# Altium schematic symbol library LATTICEPLDS_Library.SchLib: 291 symbols (part 6 of 32)
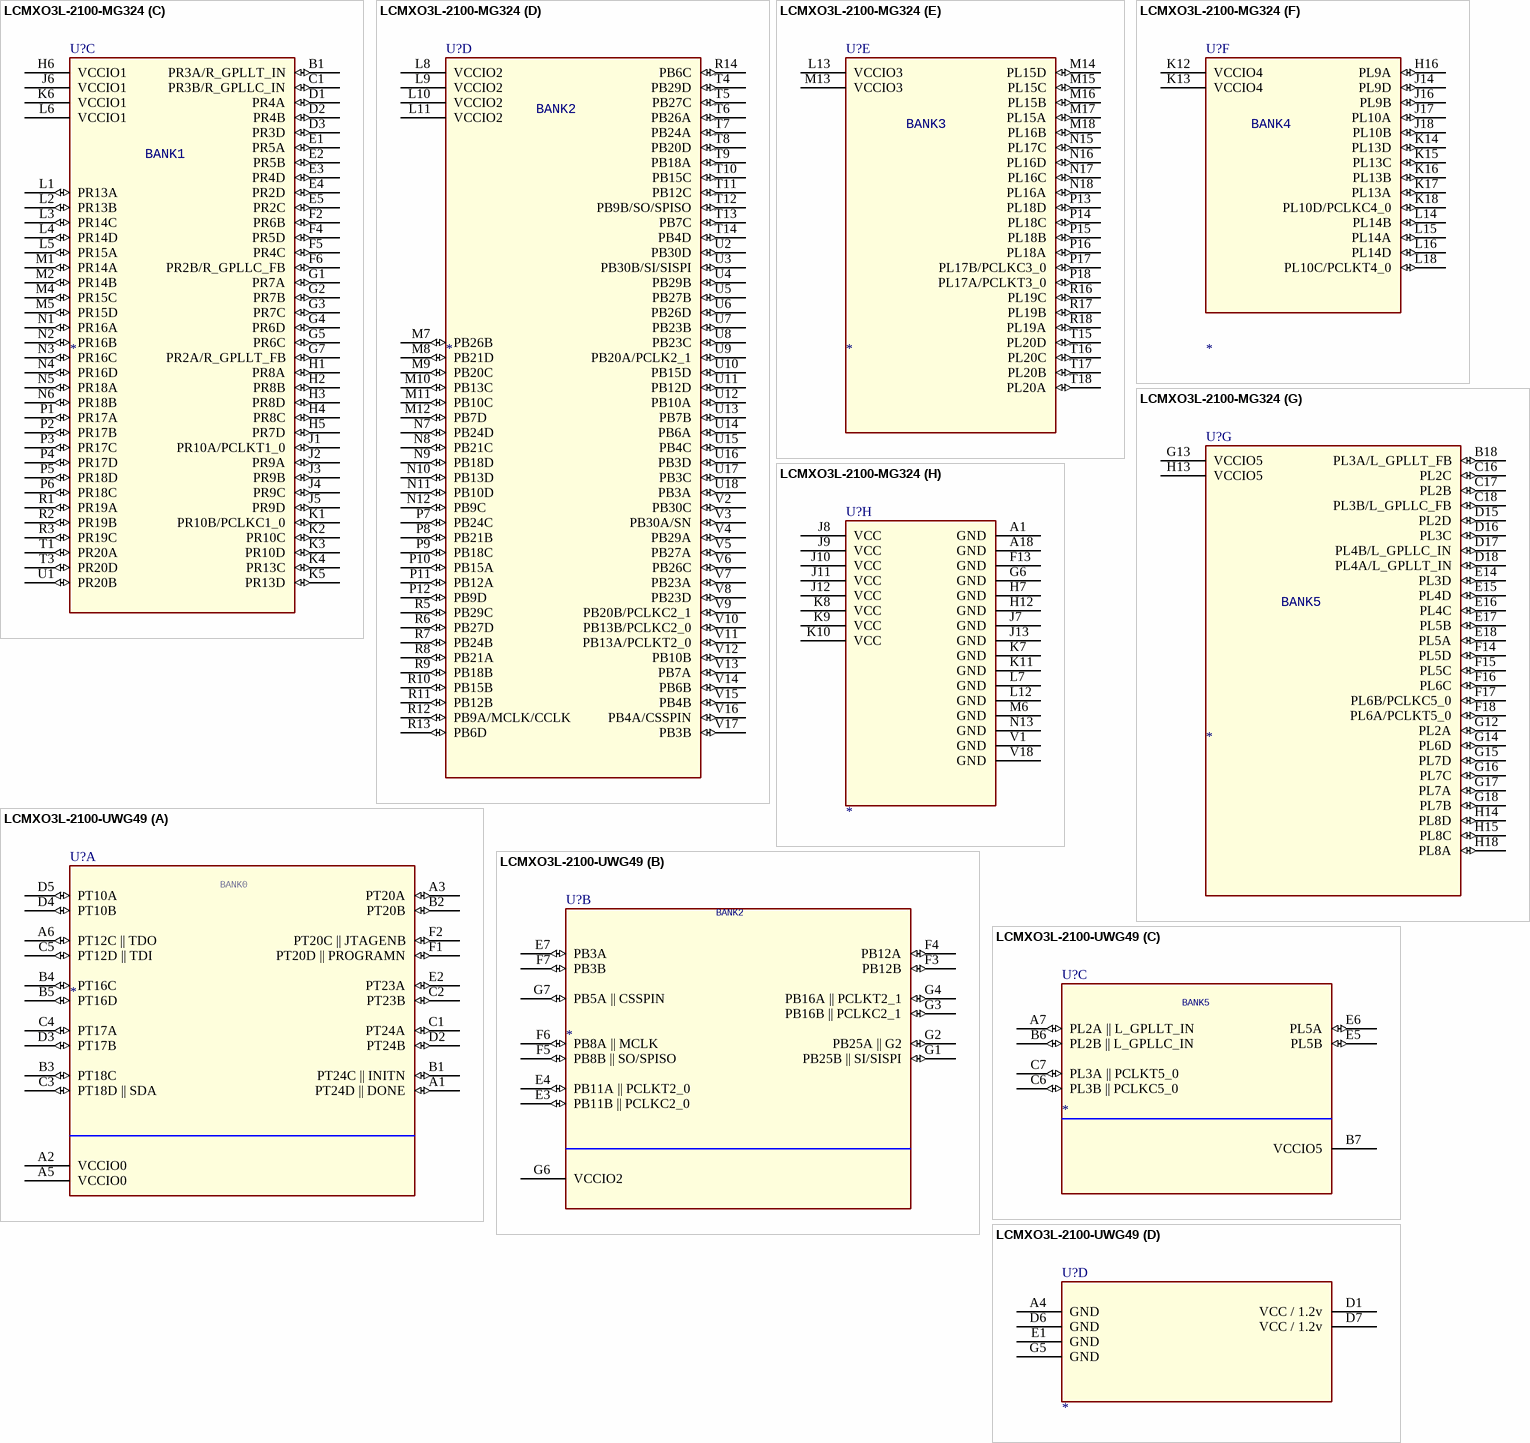
[diagram p308: symbols LCMXO3L-2100-MG324 to LCMXO3L-2100-UWG49]

## LCMXO3L-2100-MG324
designator U?
SWAP_INFO: (S1+S2+S3+S4+S5+S6+S7+S8); SPLIT_INST: TRUE
part A pins: A2 PT28B (io), A3 PT27A (io), A4 PT26A (io), A5 PT25A (io), A6 PT24C (io), A7 PT23A (io), A8 PT21A (io), A9 PT20D/SDA/PCLKC0_0 (io), A10 PT18A/PCLKTO_1 (io), A11 PT14A (io), A12 PT13A (io), A13 PT12D (io), A14 PT12A (io), A15 PT11A (io), A16 PT10A (io), A17 PT9A (io), B2 PT28A (io), B3 PT27B (io), B4 PT26B (io), B5 PT25B (io), B6 PT24D (io), B7 PT23B (io), B8 PT21B (io), B9 PT20C/SCL/PCLKT0_0 (io), B10 PT18B/PCLKC0_1 (io), B11 PT14B (io), B12 PT13B (io), B13 PT12C (io), B14 PT12B (io), B15 PT11B (io), B16 PT10B (io), B17 PT9B (io)
part B pins: C2 NC (io), C3 PT28C/INITN (io), C4 PT27C (io), C5 PT26C (io), C6 PT25D (io), C7 PT24B (io), C8 PT21C (io), C9 PT19C (io), C10 PT19B (io), C11 PT14C (io), C12 PT13C/TDO (io), C13 NC (io), C14 PT11C (io), C15 PT9C (io), D4 PT28D/DONE (io), D5 PT27D (io), D6 PT25C (io), D7 PT24A (io), D8 PT22D (io), D9 PT19D (io), D10 PT19A (io), D11 PT14D (io), D12 PT13D/TDI (io), D13 PT11D (io), D14 PT9D (io), E6 PT26D (io), E7 PT23D/PROGRAMN (io), E8 PT22C (io), E9 PT20A (io), E10 PT18D (io), E11 PT15D/TMS (io), E12 NC (io), E13 PT10C (io), F1 NC (io), F3 NC (io), F7 PT23C/JTAGENB (io), F8 PT22B (io), F9 PT20B (io), F10 PT18C (io), F11 PT15C/TCK (io), F12 PT10D (io), G8 PT22A (io), G9 PT21D (io), G10 PT15B (io), G11 PT15A (io), H8 VCCIO0 (power), H9 VCCIO0 (power), H10 VCCIO0 (power), H11 VCCIO0 (power), H17 NC (io), J15 NC (io), L17 NC (io), M3 NC (io), N14 NC (io), R4 NC (io), R15 NC (io), T2 NC (io)
part C pins: B1 PR3A/R_GPLLT_IN (io), C1 PR3B/R_GPLLC_IN (io), D1 PR4A (io), D2 PR4B (io), D3 PR3D (io), E1 PR5A (io), E2 PR5B (io), E3 PR4D (io), E4 PR2D (io), E5 PR2C (io), F2 PR6B (io), F4 PR5D (io), F5 PR4C (io), F6 PR2B/R_GPLLC_FB (io), G1 PR7A (io), G2 PR7B (io), G3 PR7C (io), G4 PR6D (io), G5 PR6C (io), G7 PR2A/R_GPLLT_FB (io), H1 PR8A (io), H2 PR8B (io), H3 PR8D (io), H4 PR8C (io), H5 PR7D (io), H6 VCCIO1 (power), J1 PR10A/PCLKT1_0 (io), J2 PR9A (io), J3 PR9B (io), J4 PR9C (io), J5 PR9D (io), J6 VCCIO1 (power), K1 PR10B/PCLKC1_0 (io), K2 PR10C (io), K3 PR10D (io), K4 PR13C (io), K5 PR13D (io), K6 VCCIO1 (power), L1 PR13A (io), L2 PR13B (io), L3 PR14C (io), L4 PR14D (io), L5 PR15A (io), L6 VCCIO1 (power), M1 PR14A (io), M2 PR14B (io), M4 PR15C (io), M5 PR15D (io), N1 PR16A (io), N2 PR16B (io), N3 PR16C (io), N4 PR16D (io), N5 PR18A (io), N6 PR18B (io), P1 PR17A (io), P2 PR17B (io), P3 PR17C (io), P4 PR17D (io), P5 PR18D (io), P6 PR18C (io), R1 PR19A (io), R2 PR19B (io), R3 PR19C (io), T1 PR20A (io), T3 PR20D (io), U1 PR20B (io)
part D pins: L8 VCCIO2 (power), L9 VCCIO2 (power), L10 VCCIO2 (power), L11 VCCIO2 (power), M7 PB26B (io), M8 PB21D (io), M9 PB20C (io), M10 PB13C (io), M11 PB10C (io), M12 PB7D (io), N7 PB24D (io), N8 PB21C (io), N9 PB18D (io), N10 PB13D (io), N11 PB10D (io), N12 PB9C (io), P7 PB24C (io), P8 PB21B (io), P9 PB18C (io), P10 PB15A (io), P11 PB12A (io), P12 PB9D (io), R5 PB29C (io), R6 PB27D (io), R7 PB24B (io), R8 PB21A (io), R9 PB18B (io), R10 PB15B (io), R11 PB12B (io), R12 PB9A/MCLK/CCLK (io), R13 PB6D (io), R14 PB6C (io), T4 PB29D (io), T5 PB27C (io), T6 PB26A (io), T7 PB24A (io), T8 PB20D (io), T9 PB18A (io), T10 PB15C (io), T11 PB12C (io), T12 PB9B/SO/SPISO (io), T13 PB7C (io), T14 PB4D (io), U2 PB30D (io), U3 PB30B/SI/SISPI (io), U4 PB29B (io), U5 PB27B (io), U6 PB26D (io), U7 PB23B (io), U8 PB23C (io), U9 PB20A/PCLK2_1 (io), U10 PB15D (io), U11 PB12D (io), U12 PB10A (io), U13 PB7B (io), U14 PB6A (io), U15 PB4C (io), U16 PB3D (io), U17 PB3C (io), U18 PB3A (io), V2 PB30C (io), V3 PB30A/SN (io), V4 PB29A (io), V5 PB27A (io), V6 PB26C (io), V7 PB23A (io), V8 PB23D (io), V9 PB20B/PCLKC2_1 (io), V10 PB13B/PCLKC2_0 (io), V11 PB13A/PCLKT2_0 (io), V12 PB10B (io), V13 PB7A (io), V14 PB6B (io), V15 PB4B (io), V16 PB4A/CSSPIN (io), V17 PB3B (io)
part E pins: L13 VCCIO3 (power), M13 VCCIO3 (power), M14 PL15D (io), M15 PL15C (io), M16 PL15B (io), M17 PL15A (io), M18 PL16B (io), N15 PL17C (io), N16 PL16D (io), N17 PL16C (io), N18 PL16A (io), P13 PL18D (io), P14 PL18C (io), P15 PL18B (io), P16 PL18A (io), P17 PL17B/PCLKC3_0 (io), P18 PL17A/PCLKT3_0 (io), R16 PL19C (io), R17 PL19B (io), R18 PL19A (io), T15 PL20D (io), T16 PL20C (io), T17 PL20B (io), T18 PL20A (io)
part F pins: H16 PL9A (io), J14 PL9D (io), J16 PL9B (io), J17 PL10A (io), J18 PL10B (io), K12 VCCIO4 (power), K13 VCCIO4 (power), K14 PL13D (io), K15 PL13C (io), K16 PL13B (io), K17 PL13A (io), K18 PL10D/PCLKC4_0 (io), L14 PL14B (io), L15 PL14A (io), L16 PL14D (io), L18 PL10C/PCLKT4_0 (io)
part G pins: B18 PL3A/L_GPLLT_FB (io), C16 PL2C (io), C17 PL2B (io), C18 PL3B/L_GPLLC_FB (io), D15 PL2D (io), D16 PL3C (io), D17 PL4B/L_GPLLC_IN (io), D18 PL4A/L_GPLLT_IN (io), E14 PL3D (io), E15 PL4D (io), E16 PL4C (io), E17 PL5B (io), E18 PL5A (io), F14 PL5D (io), F15 PL5C (io), F16 PL6C (io), F17 PL6B/PCLKC5_0 (io), F18 PL6A/PCLKT5_0 (io), G12 PL2A (io), G13 VCCIO5 (power), G14 PL6D (io), G15 PL7D (io), G16 PL7C (io), G17 PL7A (io), G18 PL7B (io), H13 VCCIO5 (power), H14 PL8D (io), H15 PL8C (io), H18 PL8A (io)
part H pins: A1 GND (power), A18 GND (power), F13 GND (power), G6 GND (power), H7 GND (power), H12 GND (power), J7 GND (power), J8 VCC (power), J9 VCC (power), J10 VCC (power), J11 VCC (power), J12 VCC (power), J13 GND (power), K7 GND (power), K8 VCC (power), K9 VCC (power), K10 VCC (power), K11 GND (power), L7 GND (power), L12 GND (power), M6 GND (power), N13 GND (power), V1 GND (power), V18 GND (power)
part A text: BANK0
part B text: BANK0
part C text: BANK1
part D text: BANK2
part E text: BANK3
part F text: BANK4
part G text: BANK5

## LCMXO3L-2100-UWG49
designator U?
SWAP_INFO: (S1+S2+S3+S4); SPLIT_INST: TRUE
part A pins: A1 PT24D || DONE (io), A2 VCCIO0 (power), A3 PT20A (io), A5 VCCIO0 (power), A6 PT12C || TDO (io), B1 PT24C || INITN (io), B2 PT20B (io), B3 PT18C (io), B4 PT16C (io), B5 PT16D (io), C1 PT24A (io), C2 PT23B (io), C3 PT18D || SDA (io), C4 PT17A (io), C5 PT12D || TDI (io), D2 PT24B (io), D3 PT17B (io), D4 PT10B (io), D5 PT10A (io), E2 PT23A (io), F1 PT20D || PROGRAMN (io), F2 PT20C || JTAGENB (io)
part B pins: E3 PB11B || PCLKC2_0 (io), E4 PB11A || PCLKT2_0 (io), E7 PB3A (io), F3 PB12B (io), F4 PB12A (io), F5 PB8B || SO/SPISO (io), F6 PB8A || MCLK (io), F7 PB3B (io), G1 PB25B || SI/SISPI (io), G2 PB25A || G2 (io), G3 PB16B || PCLKC2_1 (io), G4 PB16A || PCLKT2_1 (io), G6 VCCIO2 (power), G7 PB5A || CSSPIN (io)
part C pins: A7 PL2A || L_GPLLT_IN (io), B6 PL2B || L_GPLLC_IN (io), B7 VCCIO5 (power), C6 PL3B || PCLKC5_0 (io), C7 PL3A || PCLKT5_0 (io), E5 PL5B (io), E6 PL5A (io)
part D pins: A4 GND (power), D1 VCC / 1.2v (power), D6 GND (power), D7 VCC / 1.2v (power), E1 GND (power), G5 GND (power)
part A text: BANK0
part B text: BANK2
part C text: BANK5

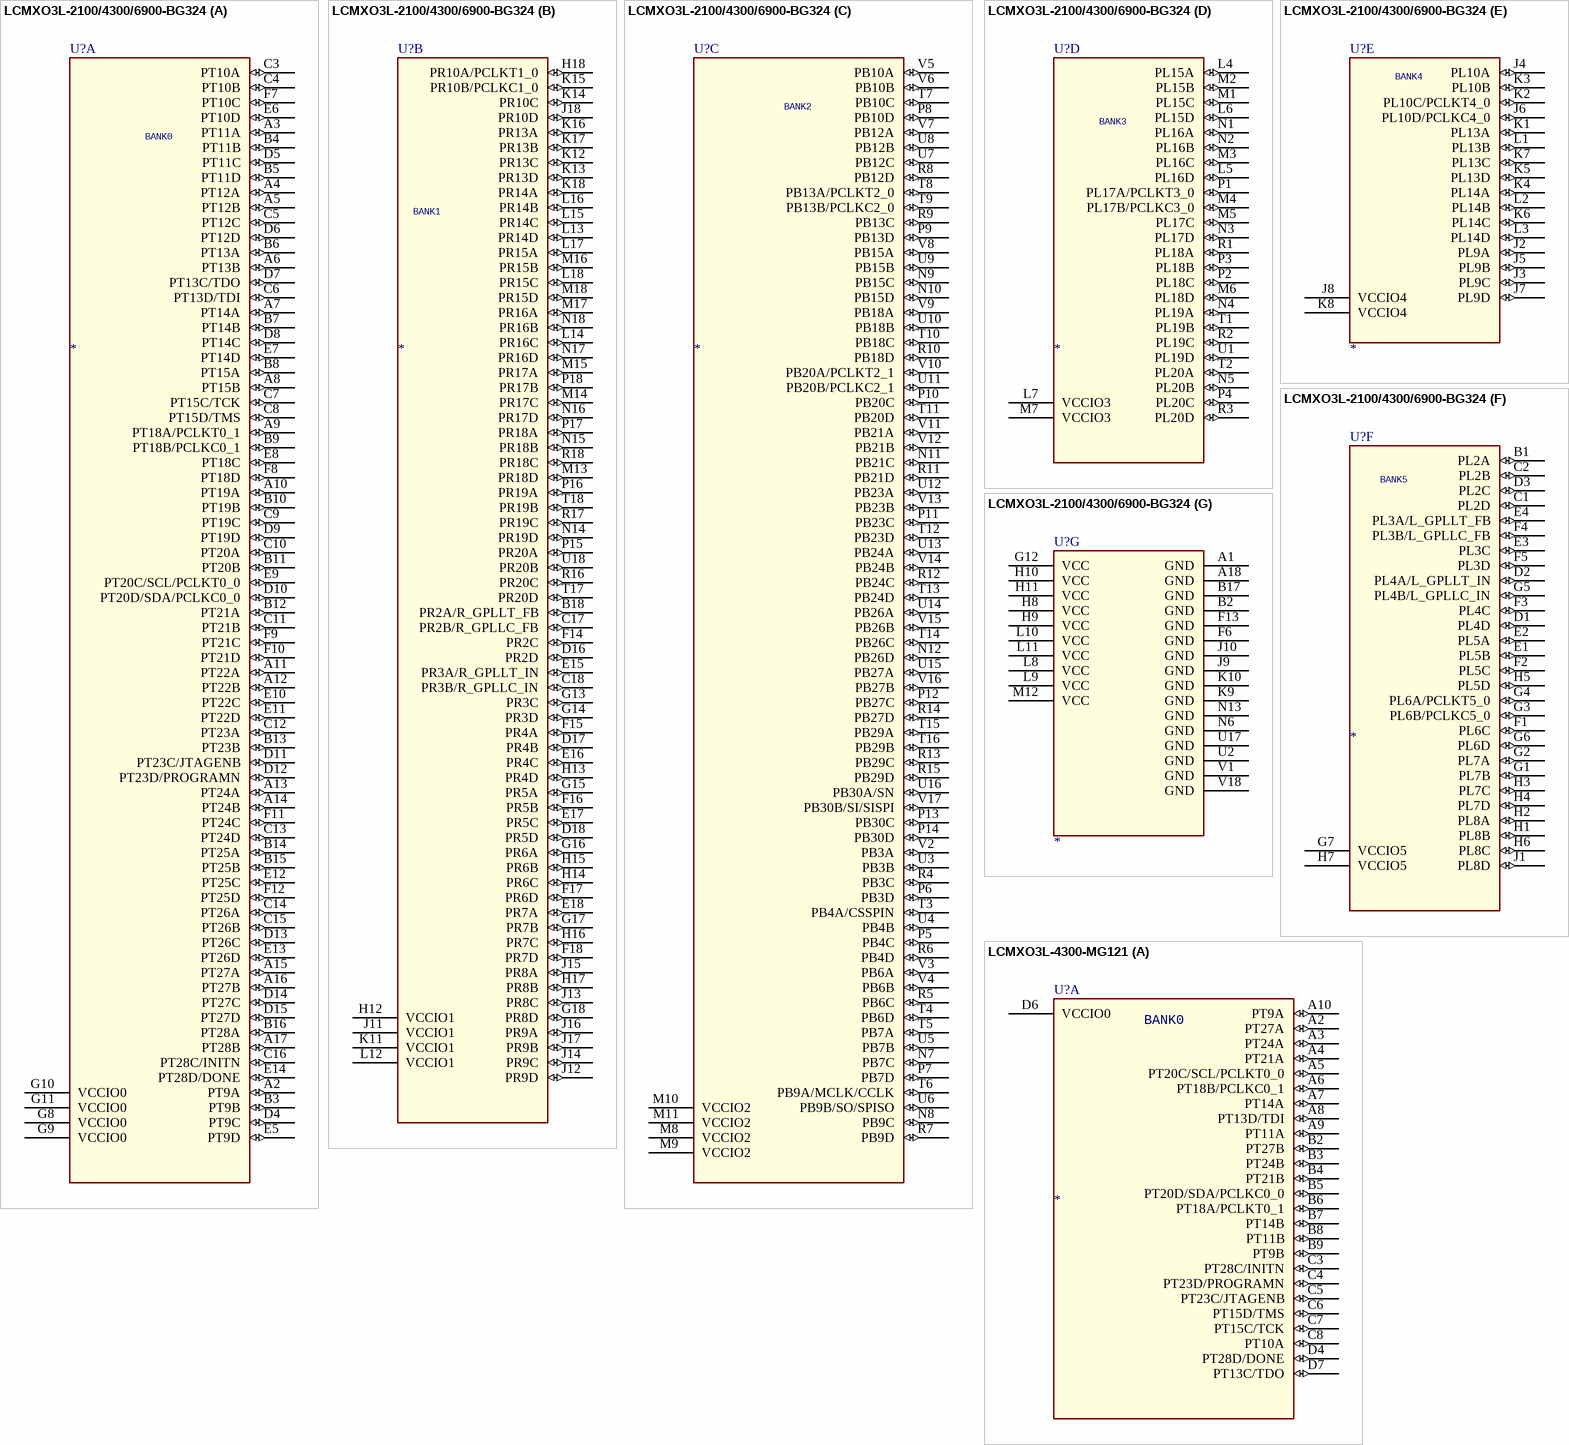
[diagram p56: symbols LCMXO3L-2100/4300/6900-BG324 to LCMXO3L-4300-MG121]

## LCMXO3L-2100/4300/6900-BG324
designator U?
SWAP_INFO: (S1+S2+S3+S4+S5+S6+S7); SPLIT_INST: TRUE
part A pins: A2 PT9A (io), A3 PT11A (io), A4 PT12A (io), A5 PT12B (io), A6 PT13B (io), A7 PT14A (io), A8 PT15B (io), A9 PT18A/PCLKT0_1 (io), A10 PT19A (io), A11 PT22A (io), A12 PT22B (io), A13 PT24A (io), A14 PT24B (io), A15 PT27A (io), A16 PT27B (io), A17 PT28B (io), B3 PT9B (io), B4 PT11B (io), B5 PT11D (io), B6 PT13A (io), B7 PT14B (io), B8 PT15A (io), B9 PT18B/PCLKC0_1 (io), B10 PT19B (io), B11 PT20B (io), B12 PT21A (io), B13 PT23B (io), B14 PT25A (io), B15 PT25B (io), B16 PT28A (io), C3 PT10A (io), C4 PT10B (io), C5 PT12C (io), C6 PT13D/TDI (io), C7 PT15C/TCK (io), C8 PT15D/TMS (io), C9 PT19C (io), C10 PT20A (io), C11 PT21B (io), C12 PT23A (io), C13 PT24D (io), C14 PT26A (io), C15 PT26B (io), C16 PT28C/INITN (io), D4 PT9C (io), D5 PT11C (io), D6 PT12D (io), D7 PT13C/TDO (io), D8 PT14C (io), D9 PT19D (io), D10 PT20D/SDA/PCLKC0_0 (io), D11 PT23C/JTAGENB (io), D12 PT23D/PROGRAMN (io), D13 PT26C (io), D14 PT27C (io), D15 PT27D (io), E5 PT9D (io), E6 PT10D (io), E7 PT14D (io), E8 PT18C (io), E9 PT20C/SCL/PCLKT0_0 (io), E10 PT22C (io), E11 PT22D (io), E12 PT25C (io), E13 PT26D (io), E14 PT28D/DONE (io), F7 PT10C (io), F8 PT18D (io), F9 PT21C (io), F10 PT21D (io), F11 PT24C (io), F12 PT25D (io), G8 VCCIO0 (power), G9 VCCIO0 (power), G10 VCCIO0 (power), G11 VCCIO0 (power)
part B pins: B18 PR2A/R_GPLLT_FB (io), C17 PR2B/R_GPLLC_FB (io), C18 PR3B/R_GPLLC_IN (io), D16 PR2D (io), D17 PR4B (io), D18 PR5D (io), E15 PR3A/R_GPLLT_IN (io), E16 PR4C (io), E17 PR5C (io), E18 PR7A (io), F14 PR2C (io), F15 PR4A (io), F16 PR5B (io), F17 PR6D (io), F18 PR7D (io), G13 PR3C (io), G14 PR3D (io), G15 PR5A (io), G16 PR6A (io), G17 PR7B (io), G18 PR8D (io), H12 VCCIO1 (power), H13 PR4D (io), H14 PR6C (io), H15 PR6B (io), H16 PR7C (io), H17 PR8B (io), H18 PR10A/PCLKT1_0 (io), J11 VCCIO1 (power), J12 PR9D (io), J13 PR8C (io), J14 PR9C (io), J15 PR8A (io), J16 PR9A (io), J17 PR9B (io), J18 PR10D (io), K11 VCCIO1 (power), K12 PR13C (io), K13 PR13D (io), K14 PR10C (io), K15 PR10B/PCLKC1_0 (io), K16 PR13A (io), K17 PR13B (io), K18 PR14A (io), L12 VCCIO1 (power), L13 PR14D (io), L14 PR16C (io), L15 PR14C (io), L16 PR14B (io), L17 PR15A (io), L18 PR15C (io), M13 PR18D (io), M14 PR17C (io), M15 PR17A (io), M16 PR15B (io), M17 PR16A (io), M18 PR15D (io), N14 PR19D (io), N15 PR18B (io), N16 PR17D (io), N17 PR16D (io), N18 PR16B (io), P15 PR20A (io), P16 PR19A (io), P17 PR18A (io), P18 PR17B (io), R16 PR20C (io), R17 PR19C (io), R18 PR18C (io), T17 PR20D (io), T18 PR19B (io), U18 PR20B (io)
part C pins: M8 VCCIO2 (power), M9 VCCIO2 (power), M10 VCCIO2 (power), M11 VCCIO2 (power), N7 PB7C (io), N8 PB9C (io), N9 PB15C (io), N10 PB15D (io), N11 PB21C (io), N12 PB26D (io), P5 PB4C (io), P6 PB3D (io), P7 PB7D (io), P8 PB10D (io), P9 PB13D (io), P10 PB20C (io), P11 PB23C (io), P12 PB27C (io), P13 PB30C (io), P14 PB30D (io), R4 PB3C (io), R5 PB6C (io), R6 PB4D (io), R7 PB9D (io), R8 PB12D (io), R9 PB13C (io), R10 PB18D (io), R11 PB21D (io), R12 PB24C (io), R13 PB29C (io), R14 PB27D (io), R15 PB29D (io), T3 PB4A/CSSPIN (io), T4 PB6D (io), T5 PB7A (io), T6 PB9A/MCLK/CCLK (io), T7 PB10C (io), T8 PB13A/PCLKT2_0 (io), T9 PB13B/PCLKC2_0 (io), T10 PB18C (io), T11 PB20D (io), T12 PB23D (io), T13 PB24D (io), T14 PB26C (io), T15 PB29A (io), T16 PB29B (io), U3 PB3B (io), U4 PB4B (io), U5 PB7B (io), U6 PB9B/SO/SPISO (io), U7 PB12C (io), U8 PB12B (io), U9 PB15B (io), U10 PB18B (io), U11 PB20B/PCLKC2_1 (io), U12 PB23A (io), U13 PB24A (io), U14 PB26A (io), U15 PB27A (io), U16 PB30A/SN (io), V2 PB3A (io), V3 PB6A (io), V4 PB6B (io), V5 PB10A (io), V6 PB10B (io), V7 PB12A (io), V8 PB15A (io), V9 PB18A (io), V10 PB20A/PCLKT2_1 (io), V11 PB21A (io), V12 PB21B (io), V13 PB23B (io), V14 PB24B (io), V15 PB26B (io), V16 PB27B (io), V17 PB30B/SI/SISPI (io)
part D pins: L4 PL15A (io), L5 PL16D (io), L6 PL15D (io), L7 VCCIO3 (power), M1 PL15C (io), M2 PL15B (io), M3 PL16C (io), M4 PL17B/PCLKC3_0 (io), M5 PL17C (io), M6 PL18D (io), M7 VCCIO3 (power), N1 PL16A (io), N2 PL16B (io), N3 PL17D (io), N4 PL19A (io), N5 PL20B (io), P1 PL17A/PCLKT3_0 (io), P2 PL18C (io), P3 PL18B (io), P4 PL20C (io), R1 PL18A (io), R2 PL19C (io), R3 PL20D (io), T1 PL19B (io), T2 PL20A (io), U1 PL19D (io)
part E pins: J2 PL9A (io), J3 PL9C (io), J4 PL10A (io), J5 PL9B (io), J6 PL10D/PCLKC4_0 (io), J7 PL9D (io), J8 VCCIO4 (power), K1 PL13A (io), K2 PL10C/PCLKT4_0 (io), K3 PL10B (io), K4 PL14A (io), K5 PL13D (io), K6 PL14C (io), K7 PL13C (io), K8 VCCIO4 (power), L1 PL13B (io), L2 PL14B (io), L3 PL14D (io)
part F pins: B1 PL2A (io), C1 PL2D (io), C2 PL2B (io), D1 PL4D (io), D2 PL4A/L_GPLLT_IN (io), D3 PL2C (io), E1 PL5B (io), E2 PL5A (io), E3 PL3C (io), E4 PL3A/L_GPLLT_FB (io), F1 PL6C (io), F2 PL5C (io), F3 PL4C (io), F4 PL3B/L_GPLLC_FB (io), F5 PL3D (io), G1 PL7B (io), G2 PL7A (io), G3 PL6B/PCLKC5_0 (io), G4 PL6A/PCLKT5_0 (io), G5 PL4B/L_GPLLC_IN (io), G6 PL6D (io), G7 VCCIO5 (power), H1 PL8B (io), H2 PL8A (io), H3 PL7C (io), H4 PL7D (io), H5 PL5D (io), H6 PL8C (io), H7 VCCIO5 (power), J1 PL8D (io)
part G pins: A1 GND (power), A18 GND (power), B2 GND (power), B17 GND (power), F6 GND (power), F13 GND (power), G12 VCC (power), H8 VCC (power), H9 VCC (power), H10 VCC (power), H11 VCC (power), J9 GND (power), J10 GND (power), K9 GND (power), K10 GND (power), L8 VCC (power), L9 VCC (power), L10 VCC (power), L11 VCC (power), M12 VCC (power), N6 GND (power), N13 GND (power), U2 GND (power), U17 GND (power), V1 GND (power), V18 GND (power)
part A text: BANK0
part B text: BANK1
part C text: BANK2
part D text: BANK3
part E text: BANK4
part F text: BANK5

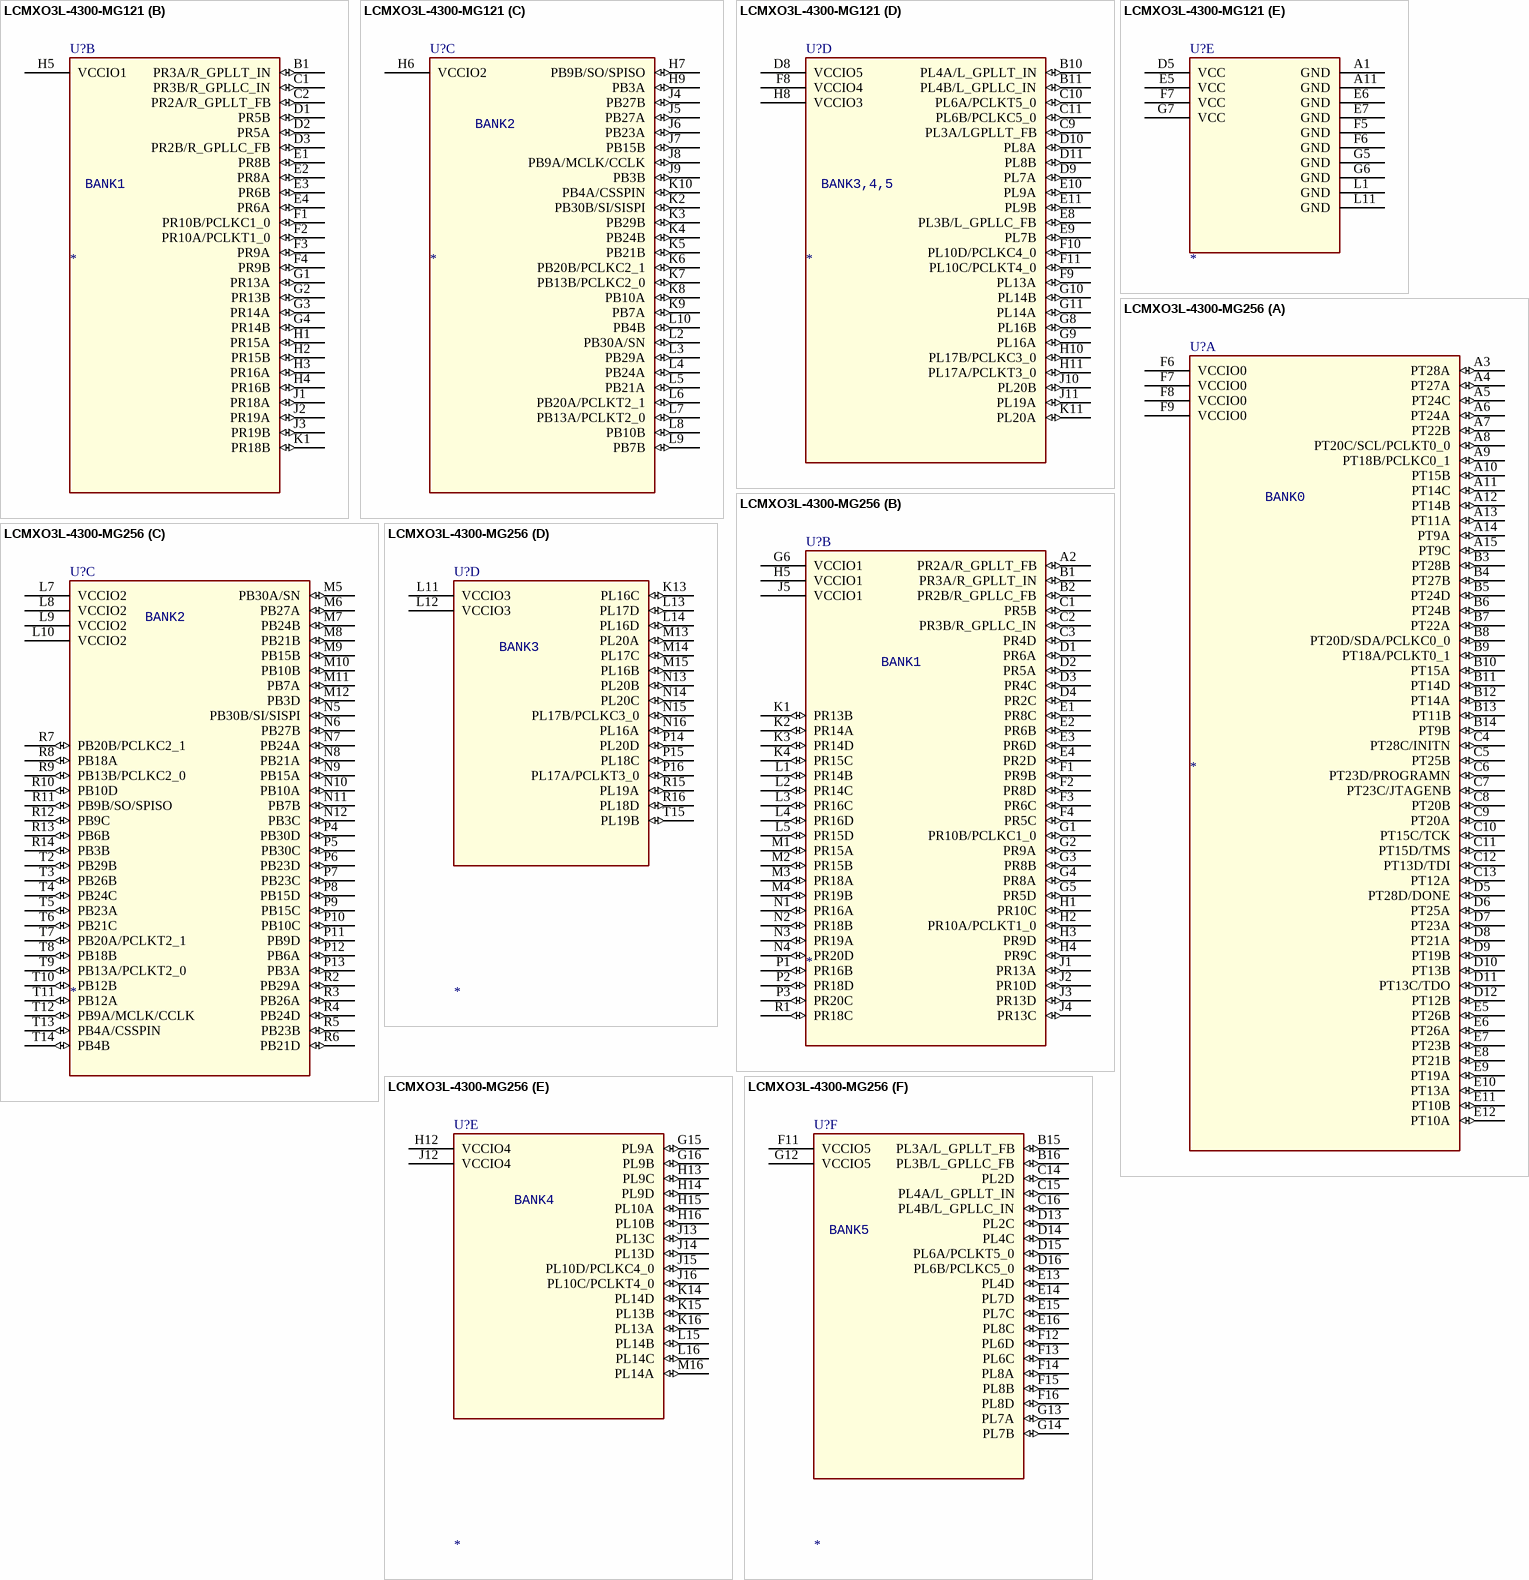
[diagram p57: symbols LCMXO3L-4300-MG121 to LCMXO3L-4300-MG256]

## LCMXO3L-4300-MG121
designator U?
SWAP_INFO: (S1+S2+S3+S4+S5); SPLIT_INST: TRUE
part A pins: A2 PT27A (io), A3 PT24A (io), A4 PT21A (io), A5 PT20C/SCL/PCLKT0_0 (io), A6 PT18B/PCLKC0_1 (io), A7 PT14A (io), A8 PT13D/TDI (io), A9 PT11A (io), A10 PT9A (io), B2 PT27B (io), B3 PT24B (io), B4 PT21B (io), B5 PT20D/SDA/PCLKC0_0 (io), B6 PT18A/PCLKT0_1 (io), B7 PT14B (io), B8 PT11B (io), B9 PT9B (io), C3 PT28C/INITN (io), C4 PT23D/PROGRAMN (io), C5 PT23C/JTAGENB (io), C6 PT15D/TMS (io), C7 PT15C/TCK (io), C8 PT10A (io), D4 PT28D/DONE (io), D6 VCCIO0 (power), D7 PT13C/TDO (io)
part B pins: B1 PR3A/R_GPLLT_IN (io), C1 PR3B/R_GPLLC_IN (io), C2 PR2A/R_GPLLT_FB (io), D1 PR5B (io), D2 PR5A (io), D3 PR2B/R_GPLLC_FB (io), E1 PR8B (io), E2 PR8A (io), E3 PR6B (io), E4 PR6A (io), F1 PR10B/PCLKC1_0 (io), F2 PR10A/PCLKT1_0 (io), F3 PR9A (io), F4 PR9B (io), G1 PR13A (io), G2 PR13B (io), G3 PR14A (io), G4 PR14B (io), H1 PR15A (io), H2 PR15B (io), H3 PR16A (io), H4 PR16B (io), H5 VCCIO1 (power), J1 PR18A (io), J2 PR19A (io), J3 PR19B (io), K1 PR18B (io)
part C pins: H6 VCCIO2 (power), H7 PB9B/SO/SPISO (io), H9 PB3A (io), J4 PB27B (io), J5 PB27A (io), J6 PB23A (io), J7 PB15B (io), J8 PB9A/MCLK/CCLK (io), J9 PB3B (io), K2 PB30B/SI/SISPI (io), K3 PB29B (io), K4 PB24B (io), K5 PB21B (io), K6 PB20B/PCLKC2_1 (io), K7 PB13B/PCLKC2_0 (io), K8 PB10A (io), K9 PB7A (io), K10 PB4A/CSSPIN (io), L2 PB30A/SN (io), L3 PB29A (io), L4 PB24A (io), L5 PB21A (io), L6 PB20A/PCLKT2_1 (io), L7 PB13A/PCLKT2_0 (io), L8 PB10B (io), L9 PB7B (io), L10 PB4B (io)
part D pins: B10 PL4A/L_GPLLT_IN (io), B11 PL4B/L_GPLLC_IN (io), C9 PL3A/LGPLLT_FB (io), C10 PL6A/PCLKT5_0 (io), C11 PL6B/PCLKC5_0 (io), D8 VCCIO5 (power), D9 PL7A (io), D10 PL8A (io), D11 PL8B (io), E8 PL3B/L_GPLLC_FB (io), E9 PL7B (io), E10 PL9A (io), E11 PL9B (io), F8 VCCIO4 (power), F9 PL13A (io), F10 PL10D/PCLKC4_0 (io), F11 PL10C/PCLKT4_0 (io), G8 PL16B (io), G9 PL16A (io), G10 PL14B (io), G11 PL14A (io), H8 VCCIO3 (power), H10 PL17B/PCLKC3_0 (io), H11 PL17A/PCLKT3_0 (io), J10 PL20B (io), J11 PL19A (io), K11 PL20A (io)
part E pins: A1 GND (power), A11 GND (power), D5 VCC (power), E5 VCC (power), E6 GND (power), E7 GND (power), F5 GND (power), F6 GND (power), F7 VCC (power), G5 GND (power), G6 GND (power), G7 VCC (power), L1 GND (power), L11 GND (power)
